# Altium footprint library KwantLib.PcbLib: 249 footprints (part 3 of 16)
Each footprint in its own frame and in the unit in brackets; x right, y up, seen from the top. Pads: shape width x height; smd on the part's side, far side on the other; paste and mask are expansions set on the pad; w line width, h text height; cw(c..) or ccw(c..) is an arc to the next point about the centre after c.
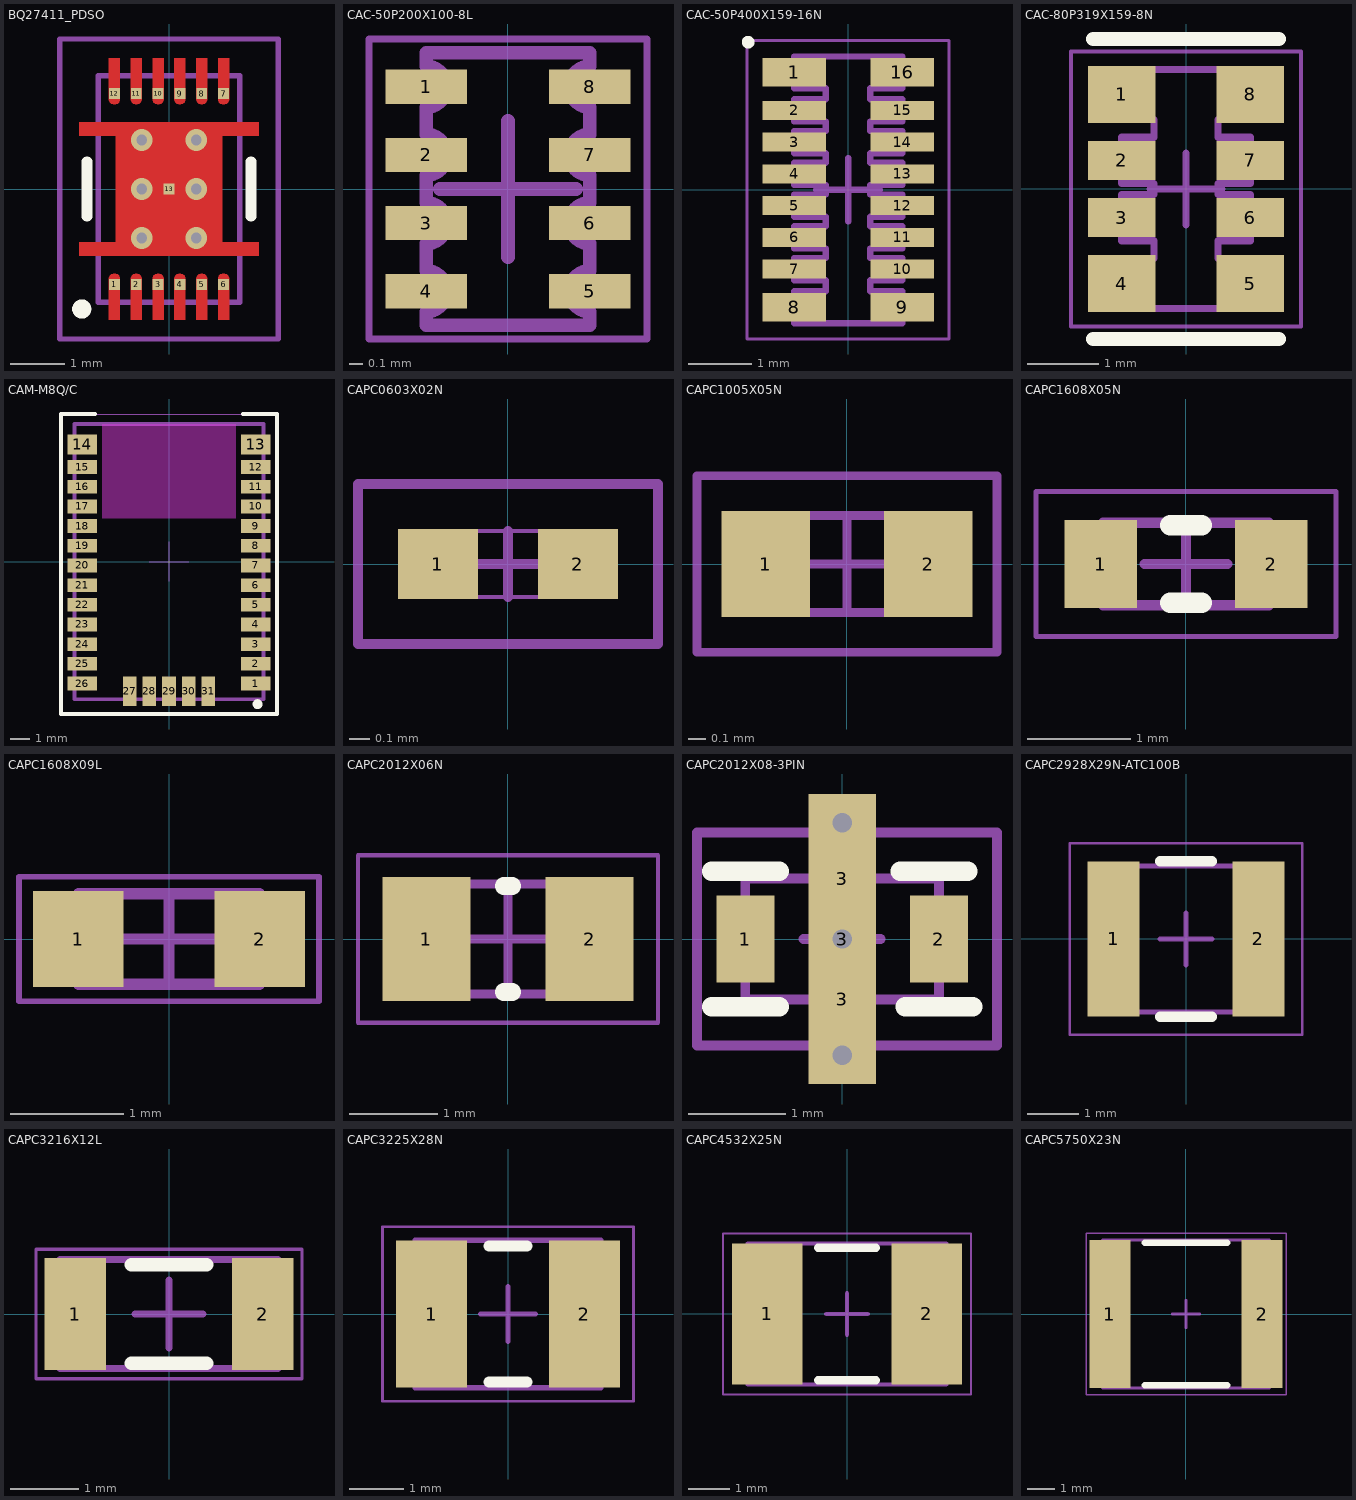
[diagram p2: the footprints below, top view; thin cyan lines are the x and y axes]

## BQ27411_PDSO [mm]
height 1
pads (13):
  rect 0.2x0.2 smd mask+0: 1(-1,-1.75) 2(-0.6,-1.75) 3(-0.2,-1.75) 4(0.2,-1.75) 5(0.6,-1.75) 6(1,-1.75) 7(1,1.75) 8(0.6,1.75) 9(0.2,1.75) 10(-0.2,1.75) 11(-0.6,1.75) 12(-1,1.75)
  rect 0.2x0.2 smd paste-1 mask+0: 13(0,0)
via -0.5,-0.9 diameter 0.4 hole 0.2
via -0.5,0 diameter 0.4 hole 0.2
via -0.5,0.9 diameter 0.4 hole 0.2
via 0.5,0.9 diameter 0.4 hole 0.2
via 0.5,0 diameter 0.4 hole 0.2
via 0.5,-0.9 diameter 0.4 hole 0.2
Top Layer:
  region: -1.65,-1.225 -1.65,-0.975 -0.975,-0.975 -0.975,0.975 -1.65,0.975 -1.65,1.225 1.65,1.225 1.65,0.975 0.975,0.975 0.975,-0.975 1.65,-0.975 1.65,-1.225
  region: 0.9,-2.4 1.1,-2.4 1.1,-1.65 1.1,-1.63 1.085,-1.593 1.057,-1.565 1.02,-1.55 1,-1.55 0.98,-1.55 0.943,-1.565 0.915,-1.593 0.9,-1.63 0.9,-1.65
  region: 0.5,-2.4 0.7,-2.4 0.7,-1.65 0.7,-1.63 0.685,-1.593 0.657,-1.565 0.62,-1.55 0.6,-1.55 0.58,-1.55 0.543,-1.565 0.515,-1.593 0.5,-1.63 0.5,-1.65
  region: 0.1,-2.4 0.3,-2.4 0.3,-1.65 0.3,-1.63 0.285,-1.593 0.257,-1.565 0.22,-1.55 0.2,-1.55 0.18,-1.55 0.143,-1.565 0.115,-1.593 0.1,-1.63 0.1,-1.65
  region: -0.3,-2.4 -0.1,-2.4 -0.1,-1.65 -0.1,-1.63 -0.115,-1.593 -0.143,-1.565 -0.18,-1.55 -0.2,-1.55 -0.22,-1.55 -0.257,-1.565 -0.285,-1.593 -0.3,-1.63 -0.3,-1.65
  region: -0.7,-2.4 -0.7,-1.65 -0.7,-1.63 -0.685,-1.593 -0.657,-1.565 -0.62,-1.55 -0.6,-1.55 -0.58,-1.55 -0.543,-1.565 -0.515,-1.593 -0.5,-1.63 -0.5,-1.65 -0.5,-2.4
  region: -1.1,-2.4 -0.9,-2.4 -0.9,-1.65 -0.9,-1.63 -0.915,-1.593 -0.943,-1.565 -0.98,-1.55 -1,-1.55 -1.02,-1.55 -1.057,-1.565 -1.085,-1.593 -1.1,-1.63 -1.1,-1.65
  region: 1,1.55 0.98,1.55 0.943,1.565 0.915,1.593 0.9,1.63 0.9,1.65 0.9,2.4 1.1,2.4 1.1,1.65 1.1,1.63 1.085,1.593 1.057,1.565 1.02,1.55
  region: 0.6,1.55 0.58,1.55 0.543,1.565 0.515,1.593 0.5,1.63 0.5,1.65 0.5,2.4 0.7,2.4 0.7,1.65 0.7,1.63 0.685,1.593 0.657,1.565 0.62,1.55
  region: 0.2,1.55 0.18,1.55 0.143,1.565 0.115,1.593 0.1,1.63 0.1,1.65 0.1,2.4 0.3,2.4 0.3,1.65 0.3,1.63 0.285,1.593 0.257,1.565 0.22,1.55
  region: -0.2,1.55 -0.22,1.55 -0.257,1.565 -0.285,1.593 -0.3,1.63 -0.3,1.65 -0.3,2.4 -0.1,2.4 -0.1,1.65 -0.1,1.63 -0.115,1.593 -0.143,1.565 -0.18,1.55
  region: -0.7,1.65 -0.7,2.4 -0.5,2.4 -0.5,1.65 -0.5,1.63 -0.515,1.593 -0.543,1.565 -0.58,1.55 -0.6,1.55 -0.62,1.55 -0.657,1.565 -0.685,1.593 -0.7,1.63
  region: -1,1.55 -1.02,1.55 -1.057,1.565 -1.085,1.593 -1.1,1.63 -1.1,1.65 -1.1,2.4 -0.9,2.4 -0.9,1.65 -0.9,1.63 -0.915,1.593 -0.943,1.565 -0.98,1.55
Top Overlay:
  circle w0.2: c-1.6,-2.2 r0.075
  lines w0.2: -1.5,-0.5 -1.5,0.5 ; 1.5,-0.5 1.5,0.5
Top Paste:
  drawing of 20 lines, arcs and shapes, not listed
Mechanical 13:
  lines w0.1: -1.3,-2.075 -1.3,2.075 1.3,2.075 1.3,-2.075 -1.3,-2.075
Mechanical 15:
  lines w0.1: -0.75,0 0.75,0 ; 0,-0.75 0,0.75 ; -2,-2.75 2,-2.75 2,2.75 -2,2.75 -2,-2.75
3D body: height 1, standoff 0, extent -1.3,-2.075 1.3,2.075

## CAC-50P200X100-8L [mm] "Chip Array, Concave, 8-Leads, Pitch 0.50mm,  Body 2.00x1.00mm,  IPC High Density"
height 0.45
pads (8):
  rect 0.6x0.25 smd mask+0.07: 1(-0.6,0.75) 2(-0.6,0.25) 3(-0.6,-0.25) 4(-0.6,-0.75) 5(0.6,-0.75) 6(0.6,-0.25) 7(0.6,0.25) 8(0.6,0.75)
Mechanical 13:
  lines w0.1: -0.6,-1 0.6,-1 0.6,-0.9 cw(c0.6,-0.75) 0.6,-0.6 0.6,-0.4 cw(c0.6,-0.25) 0.6,-0.1 0.6,0.1 cw(c0.6,0.25) 0.6,0.4 0.6,0.6 cw(c0.6,0.75) 0.6,0.9 0.6,1 -0.6,1 -0.6,0.9 cw(c-0.6,0.75) -0.6,0.6 -0.6,0.4 cw(c-0.6,0.25) -0.6,0.1 -0.6,-0.1 cw(c-0.6,-0.25) -0.6,-0.4 -0.6,-0.6 cw(c-0.6,-0.75) -0.6,-0.9 -0.6,-1
Mechanical 15:
  lines w0.05: -1.02,-1.1 1.02,-1.1 1.02,1.1 -1.02,1.1 -1.02,-1.1
  lines w0.1: -0.5,0 0.5,0 ; 0,-0.5 0,0.5
3D body "CAC-50P200X100-8L.step": height 0.45, standoff 0, extent -0.55,-1 0.55,1

## CAC-50P400X159-16N [mm] "Chip Array, ConvexS, 16-Leads, Pitch 0.50mm,  Body 4.00x1.60mm,  IPC Medium Density"
height 0.45
pads (16):
  rect 1x0.45 smd mask+0.075: 1(-0.85,1.85) 8(-0.85,-1.85) 9(0.85,-1.85) 16(0.85,1.85)
  rect 1x0.3 smd mask+0.075: 2(-0.85,1.25) 3(-0.85,0.75) 4(-0.85,0.25) 5(-0.85,-0.25) 6(-0.85,-0.75) 7(-0.85,-1.25) 10(0.85,-1.25) 11(0.85,-0.75) 12(0.85,-0.25) 13(0.85,0.25) 14(0.85,0.75) 15(0.85,1.25)
Top Overlay:
  circle w0.1: c-1.575,2.325 r0.05
Mechanical 13:
  lines w0.1: -0.85,-2.1 -0.85,-1.6 -0.35,-1.6 -0.35,-1.425 -0.85,-1.425 -0.85,-1.075 -0.35,-1.075 -0.35,-0.925 -0.85,-0.925 -0.85,-0.575 -0.35,-0.575 -0.35,-0.425 -0.85,-0.425 -0.85,-0.075 -0.35,-0.075 -0.35,0.075 -0.85,0.075 -0.85,0.425 -0.35,0.425 -0.35,0.575 -0.85,0.575 -0.85,0.925 -0.35,0.925 -0.35,1.075 -0.85,1.075 -0.85,1.425 -0.35,1.425 -0.35,1.6 -0.85,1.6 -0.85,2.1 0.85,2.1 0.85,1.6 0.35,1.6 0.35,1.425 0.85,1.425 0.85,1.075 0.35,1.075 0.35,0.925 0.85,0.925 0.85,0.575 0.35,0.575 0.35,0.425 0.85,0.425 0.85,0.075 0.35,0.075 0.35,-0.075 0.85,-0.075 0.85,-0.425 0.35,-0.425 0.35,-0.575 0.85,-0.575 0.85,-0.925 0.35,-0.925 0.35,-1.075 0.85,-1.075 0.85,-1.425 0.35,-1.425 0.35,-1.6 0.85,-1.6 0.85,-2.1 -0.85,-2.1
Mechanical 15:
  lines w0.05: -1.59,-2.35 -1.59,2.35 1.59,2.35 1.59,-2.35 -1.59,-2.35
  lines w0.1: -0.5,0 0.5,0 ; 0,-0.5 0,0.5
3D body "CAC-50P400X159-16N.step": height 0.45, standoff 0, extent -0.925,-2.1 0.925,2.1

## CAC-80P319X159-8N [mm] "Chip Array, ConvexS, 8-Leads, Pitch 0.80mm,  Body 3.20x1.60mm,  IPC Medium Density"
height 1
pads (8):
  rect 0.95x0.8 smd mask+0.07: 1(-0.9,1.325) 4(-0.9,-1.325) 5(0.9,-1.325) 8(0.9,1.325)
  rect 0.95x0.55 smd mask+0.07: 2(-0.9,0.4) 3(-0.9,-0.4) 6(0.9,-0.4) 7(0.9,0.4)
Top Overlay:
  lines w0.2: -1.3,-2.1 1.3,-2.1 ; -1.3,2.1 1.3,2.1
Mechanical 13:
  lines w0.1: -0.9,-1.675 -0.9,-0.975 -0.45,-0.975 -0.45,-0.725 -0.9,-0.725 -0.9,-0.075 -0.45,-0.075 -0.45,0.075 -0.9,0.075 -0.9,0.725 -0.45,0.725 -0.45,0.975 -0.9,0.975 -0.9,1.675 0.9,1.675 0.9,0.975 0.45,0.975 0.45,0.725 0.9,0.725 0.9,0.075 0.45,0.075 0.45,-0.075 0.9,-0.075 0.9,-0.725 0.45,-0.725 0.45,-0.975 0.9,-0.975 0.9,-1.675 -0.9,-1.675
Mechanical 15:
  lines w0.05: -1.61,-1.925 -1.61,1.925 1.61,1.925 1.61,-1.925 -1.61,-1.925
  lines w0.1: -0.5,0 0.5,0 ; 0,-0.5 0,0.5
3D body "CAC-80P319X159-8N.step": height 1, standoff 0, extent -0.95,-1.675 0.95,1.675

## CAM-M8Q/C [mm]
height 2
pads (31):
  rect 1.5x0.7 smd paste-0.07 mask+0.07: 1(4.4,-6.2) 2(4.4,-5.2) 3(4.4,-4.2) 4(4.4,-3.2) 5(4.4,-2.2) 6(4.4,-1.2) 7(4.4,-0.2) 8(4.4,0.8) 9(4.4,1.8) 10(4.4,2.8) 11(4.4,3.8) 12(4.4,4.8) 15(-4.4,4.8) 16(-4.4,3.8) 17(-4.4,2.8) 18(-4.4,1.8) 19(-4.4,0.8) 20(-4.4,-0.2) 21(-4.4,-1.2) 22(-4.4,-2.2) 23(-4.4,-3.2) 24(-4.4,-4.2) 25(-4.4,-5.2) 26(-4.4,-6.2)
  rect 1.5x1 smd paste-0.07 mask+0.07: 13(4.4,5.95) 14(-4.4,5.95)
  rect 0.7x1.5 smd paste-0.07 mask+0.07: 27(-2,-6.6) 28(-1,-6.6) 29(0,-6.6) 30(1,-6.6) 31(2,-6.6)
Top Overlay:
  circle w0.25: c4.5,-7.25 r0.125
  lines w0.2: -3.75,7.5 -5.5,7.5 -5.5,-7.75 5.5,-7.75 5.5,7.5 3.75,7.5
Keep-Out Layer:
  rectangle: -3.4,2.2 3.4,7
Mechanical 13:
  lines w0.2: -4.8,-7 4.8,-7 4.8,7 -4.8,7 -4.8,-7
Mechanical 15:
  lines w0.05: -1,0 1,0 ; 0,-1 0,1 ; -5.5,-7.75 5.5,-7.75 5.5,7.5 -5.5,7.5 -5.5,-7.75
3D body "CAM-M8.stp": height 2, standoff 0, extent -4.8,-7 4.8,7

## CAPC0603X02N [mm] "Chip Capacitor, 2-Leads, Body 0.60x0.30mm, IPC Medium Density"
height 0.23
pads (2):
  rect 0.4x0.35 smd paste-1: 1(-0.35,0) 2(0.35,0)
Top Paste:
  region: -0.45,-0.15 -0.46,-0.15 -0.478,-0.142 -0.492,-0.128 -0.5,-0.11 -0.5,-0.1 -0.5,0.1 -0.5,0.11 -0.492,0.128 -0.478,0.142 -0.46,0.15 -0.45,0.15 -0.225,0.15 -0.215,0.15 -0.197,0.142 -0.183,0.128 -0.175,0.11 -0.175,0.1 -0.175,-0.1 -0.175,-0.11 -0.183,-0.128 -0.197,-0.142 -0.215,-0.15 -0.225,-0.15
  region: 0.45,0.15 0.46,0.15 0.478,0.142 0.492,0.128 0.5,0.11 0.5,0.1 0.5,-0.1 0.5,-0.11 0.492,-0.128 0.478,-0.142 0.46,-0.15 0.45,-0.15 0.225,-0.15 0.215,-0.15 0.197,-0.142 0.183,-0.128 0.175,-0.11 0.175,-0.1 0.175,0.1 0.175,0.11 0.183,0.128 0.197,0.142 0.215,0.15 0.225,0.15
Mechanical 13:
  lines w0.02: -0.315,-0.165 0.315,-0.165 0.315,0.165 -0.315,0.165 -0.315,-0.165
Mechanical 15:
  lines w0.05: -0.165,0 0.165,0 ; 0,-0.165 0,0.165 ; -0.75,-0.4 0.75,-0.4 0.75,0.4 -0.75,0.4 -0.75,-0.4
3D body "CAPC0603X02N.step": height 0.23, standoff 0, extent -0.315,-0.165 0.315,0.165

## CAPC1005X05N [mm] "Chip Capacitor, 2-Leads, Body 1.00x0.50mm, IPC Medium Density"
height 0.45
pads (2):
  rect 0.5x0.6 smd paste-0.03 mask+0.07: 1(-0.46,0) 2(0.46,0)
Mechanical 13:
  lines w0.05: -0.525,-0.275 -0.525,0.275 0.525,0.275 0.525,-0.275 -0.525,-0.275
Mechanical 15:
  lines w0.05: -0.275,0 0.275,0 ; 0,-0.275 0,0.275 ; -0.85,-0.5 0.85,-0.5 0.85,0.5 -0.85,0.5 -0.85,-0.5
3D body "CAPC1005X05N.step": height 0.45, standoff 0, extent -0.525,-0.275 0.525,0.275

## CAPC1608X05N [mm] "Chip Capacitor, 2-Leads, Body 1.60x0.80mm, IPC Medium Density"
height 0.5
pads (2):
  rect 0.7x0.85 smd paste-0.05: 1(-0.825,0) 2(0.825,0)
Top Overlay:
  lines w0.2: -0.15,-0.375 0.15,-0.375 ; -0.15,0.375 0.15,0.375
Mechanical 13:
  lines w0.1: -0.8,-0.4 -0.8,0.4 0.8,0.4 0.8,-0.4 -0.8,-0.4
Mechanical 15:
  lines w0.05: -1.45,-0.7 1.45,-0.7 1.45,0.7 -1.45,0.7 -1.45,-0.7
  lines w0.1: -0.4,0 0.4,0 ; 0,-0.4 0,0.4
3D body "CAPC1608X05N.step": height 0.5, standoff 0, extent -0.8,-0.4 0.8,0.4

## CAPC1608X09L [mm] "Chip Capacitor, 2-Leads, Body 1.60x0.80mm, IPC High Density"
height 0.9
pads (2):
  rect 0.8x0.85 smd paste-0.05 mask+0.07: 1(-0.8,0) 2(0.8,0)
Mechanical 13:
  lines w0.1: -0.8,-0.4 -0.8,0.4 0.8,0.4 0.8,-0.4 -0.8,-0.4
Mechanical 15:
  lines w0.05: -1.325,-0.55 -1.325,0.55 1.325,0.55 1.325,-0.55 -1.325,-0.55
  lines w0.1: -0.4,0 0.4,0 ; 0,-0.4 0,0.4
3D body "CAPC1608X09L.step": height 0.9, standoff 0, extent -0.8,-0.4 0.8,0.4

## CAPC2012X06N [mm] "Chip Capacitor, 2-Leads, Body 2.00x1.25mm, IPC Medium Density"
height 0.6
pads (2):
  rect 1x1.4 smd: 1(-0.925,0) 2(0.925,0)
Top Overlay:
  lines w0.2: -0.05,-0.6 0.05,-0.6 ; -0.05,0.6 0.05,0.6
Mechanical 13:
  lines w0.1: -1,-0.625 1,-0.625 1,0.625 -1,0.625 -1,-0.625
Mechanical 15:
  lines w0.05: -1.7,-0.95 1.7,-0.95 1.7,0.95 -1.7,0.95 -1.7,-0.95
  lines w0.1: -0.5,0 0.5,0 ; 0,-0.5 0,0.5
3D body "CAPC2012X06N.step": height 0.6, standoff 0, extent -1,-0.625 1,0.625

## CAPC2012X08-3PIN [mm]
height 0.8
pads (5):
  rect 0.6x0.9 smd paste-0.02 mask+0.07: 1(-1,0) 2(1,0)
  rect 0.7x0.65 smd paste-0.02 mask+0.07: 3(0,-0.625) 3(0,0.625)
  rect 0.7x3 smd paste-1: 3(0,0)
via 0,0 diameter 0.4 hole 0.2
via 0,1.2 diameter 0.4 hole 0.2
via 0,-1.2 diameter 0.4 hole 0.2
Top Overlay:
  lines w0.2: -1.35,-0.7 -0.65,-0.7 ; -1.35,0.7 -0.65,0.7 ; 0.6,0.7 1.3,0.7 ; 0.65,-0.7 1.35,-0.7
Mechanical 13:
  lines w0.1: -1,-0.625 1,-0.625 1,0.625 -1,0.625 -1,-0.625
Mechanical 15:
  lines w0.1: -0.4,0 0.4,0 ; 0,-0.4 0,0.4 ; -1.5,-1.1 1.6,-1.1 1.6,1.1 -1.5,1.1 -1.5,-1.1
3D body "User Library-EMIFIL_0805.step": height 0.86, standoff 0.01, extent -1,-0.625 1,0.625

## CAPC2928X29N-ATC100B [mm] "Chip Capacitor, 2-Leads, Body 2.92x2.79mm, IPC Medium Density"
height 2.9
pads (2):
  rect 1x3 smd: 1(-1.4,0) 2(1.4,0)
Top Overlay:
  lines w0.2: -0.5,-1.5 0.5,-1.5 ; -0.5,1.5 0.5,1.5
Mechanical 13:
  lines w0.1: -1.395,-1.41 -1.395,1.41 1.395,1.41 1.395,-1.41 -1.395,-1.41
Mechanical 15:
  lines w0.05: -2.25,-1.85 -2.25,1.85 2.25,1.85 2.25,-1.85 -2.25,-1.85
  lines w0.1: -0.5,0 0.5,0 ; 0,-0.5 0,0.5
3D body "ATC100B.stp": height 2.6, standoff 0, extent -1.395,-1.41 1.395,1.41

## CAPC3216X12L [mm] "Chip Capacitor, 2-Leads, Body 3.20x1.60mm, IPC High Density"
height 1.25
pads (2):
  rect 0.9x1.65 smd paste-0.05 mask+0.07: 1(-1.375,0) 2(1.375,0)
Top Overlay:
  lines w0.2: -0.55,-0.725 0.55,-0.725 ; -0.55,0.725 0.55,0.725
Mechanical 13:
  lines w0.1: -1.6,-0.8 1.6,-0.8 1.6,0.8 -1.6,0.8 -1.6,-0.8
Mechanical 15:
  lines w0.05: -1.95,-0.95 1.95,-0.95 1.95,0.95 -1.95,0.95 -1.95,-0.95
  lines w0.1: -0.5,0 0.5,0 ; 0,-0.5 0,0.5
3D body "CAPC3216X12L.step": height 1.25, standoff 0, extent -1.6,-0.8 1.6,0.8

## CAPC3225X28N [mm] "Chip Capacitor, 2-Leads, Body 3.20x2.50mm, IPC Medium Density"
height 2.79
pads (2):
  rect 1.3x2.7 smd: 1(-1.4,0) 2(1.4,0)
Top Overlay:
  lines w0.2: -0.35,-1.25 0.35,-1.25 ; -0.35,1.25 0.35,1.25
Mechanical 13:
  lines w0.1: -1.7,-1.35 -1.7,1.35 1.7,1.35 1.7,-1.35 -1.7,-1.35
Mechanical 15:
  lines w0.05: -2.3,-1.6 -2.3,1.6 2.3,1.6 2.3,-1.6 -2.3,-1.6
  lines w0.1: -0.5,0 0.5,0 ; 0,-0.5 0,0.5
3D body "CAPC3225X28N.step": height 2.79, standoff 0, extent -1.7,-1.35 1.7,1.35

## CAPC4532X25N [mm] "Chip Capacitor, 2-Leads, Body 4.50x3.20mm, IPC Medium Density"
height 2.54
pads (2):
  rect 1.7x3.4 smd paste-0.06 mask+0.07: 1(-1.925,0) 2(1.925,0)
Top Overlay:
  lines w0.2: -0.7,-1.6 0.7,-1.6 ; -0.7,1.6 0.7,1.6
Mechanical 13:
  lines w0.1: -2.4,-1.7 -2.4,1.7 2.4,1.7 2.4,-1.7 -2.4,-1.7
Mechanical 15:
  lines w0.05: -3,-1.95 -3,1.95 3,1.95 3,-1.95 -3,-1.95
  lines w0.1: -0.5,0 0.5,0 ; 0,-0.5 0,0.5
3D body "CAPC4532X25N.step": height 2.54, standoff 0, extent -2.4,-1.7 2.4,1.7

## CAPC5750X23N [mm] "Chip Capacitor, 2-Leads, Body 5.70x5.00mm, IPC Medium Density"
height 2.3
pads (2):
  rect 1.5x5.4 smd paste-0.05 mask+0.07: 1(-2.775,0) 2(2.775,0)
Top Overlay:
  lines w0.25: -1.5,-2.6 1.5,-2.6 ; -1.5,2.6 1.5,2.6
Mechanical 13:
  lines w0.1: -3.05,-2.7 3.05,-2.7 3.05,2.7 -3.05,2.7 -3.05,-2.7
Mechanical 15:
  lines w0.05: -3.65,-2.95 3.65,-2.95 3.65,2.95 -3.65,2.95 -3.65,-2.95
  lines w0.1: -0.5,0 0.5,0 ; 0,-0.5 0,0.5
3D body "CAPC5750X23N.step": height 2.3, standoff 0, extent -3.05,-2.7 3.05,2.7